# Altium footprint library WR-TBL_Spring Clamp.PcbLib: 258 footprints (part 16 of 17)
Each footprint in its own frame and in the unit in brackets; x right, y up, seen from the top. Pads: shape width x height; smd on the part's side, far side on the other; paste and mask are expansions set on the pad; w line width, h text height; cw(c..) or ccw(c..) is an arc to the next point about the centre after c.
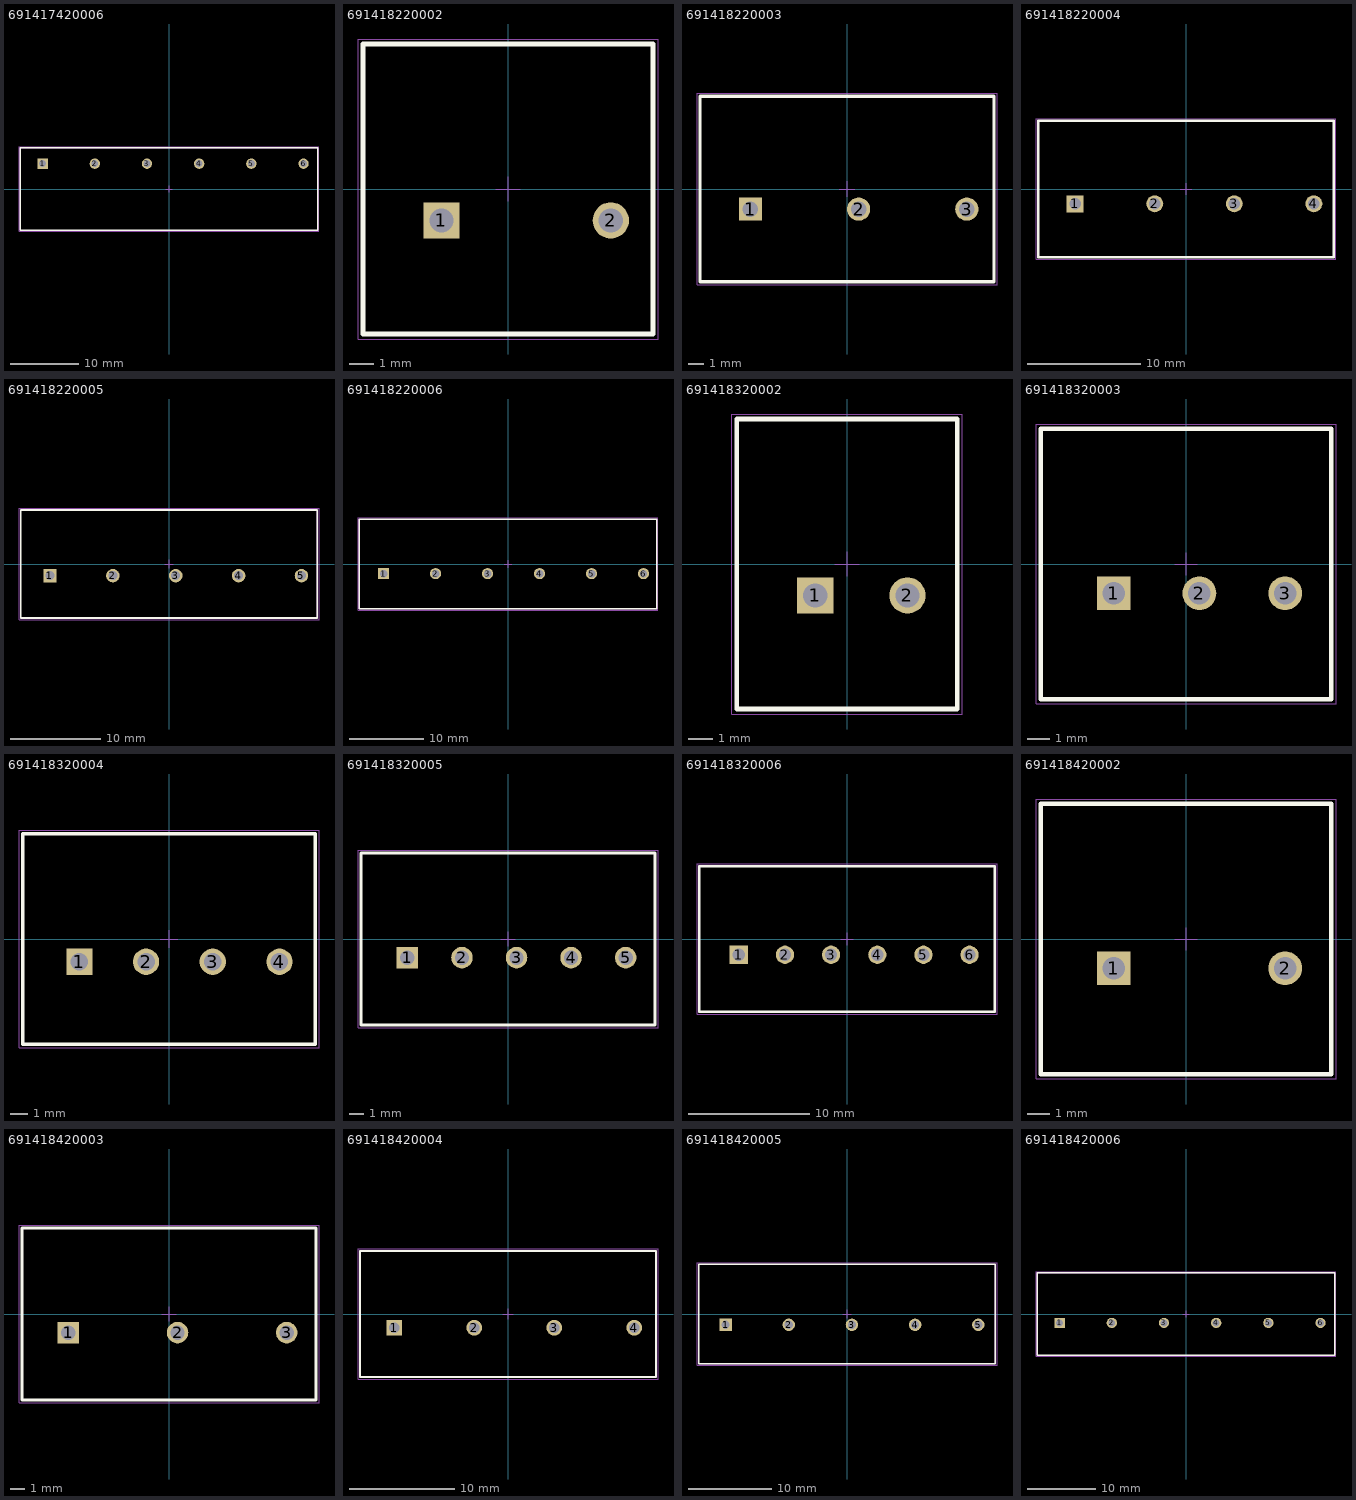
[diagram p15: the footprints below, top view; thin cyan lines are the x and y axes]

## 691417420006 [mm] "7.62 mm 45deg Entry Screwless, 6p"
height 13.2
pads (6):
  rect 1.5x1.5 hole 1: 1(-18.455,3.7)
  round 1.5 hole 1: 2(-10.835,3.7) 3(-3.215,3.7) 4(4.405,3.7) 5(12.025,3.7) 6(19.645,3.7)
Top Overlay:
  lines w0.2: -21.705,-6 -21.705,6 21.705,6 21.705,-6 -21.705,-6
Mechanical 13:
  lines w0.1: -21.705,-6 21.705,-6 21.705,6 -21.705,6 -21.705,-6
Mechanical 15:
  lines w0.05: -0.5,0 0.5,0 ; 0,-0.5 0,0.5 ; -21.905,-6.2 -21.905,6.2 21.905,6.2 21.905,-6.2 -21.905,-6.2
3D body "691417420006.stp": height 13.28, standoff -3.52, extent -21.705,-6 21.706,6

## 691418220002 [mm] "Serie 4182-7.00mm 45deg Cable Entry Screwless, 2 pins"
height 13.2
pads (2):
  rect 1.5x1.5 hole 1: 1(-2.75,-1.3)
  round 1.5 hole 1: 2(4.25,-1.3)
Top Overlay:
  lines w0.2: -6,-6 -6,6 6,6 6,-6 -6,-6
Mechanical 13:
  lines w0.1: -6,-6 6,-6 6,6 -6,6 -6,-6
Mechanical 15:
  lines w0.05: -0.5,0 0.5,0 ; 0,-0.5 0,0.5 ; -6.2,-6.2 -6.2,6.2 6.2,6.2 6.2,-6.2 -6.2,-6.2
3D body "691418220002.stp": height 13.23, standoff -3.57, extent -6,-6 6,6

## 691418220003 [mm] "Serie 4182-7.00mm 45deg Cable Entry Screwless, 3 pins"
height 13.2
pads (3):
  rect 1.5x1.5 hole 1: 1(-6.25,-1.3)
  round 1.5 hole 1: 2(0.75,-1.3) 3(7.75,-1.3)
Top Overlay:
  lines w0.2: -9.5,-6 -9.5,6 9.5,6 9.5,-6 -9.5,-6
Mechanical 13:
  lines w0.1: -9.5,-6 9.5,-6 9.5,6 -9.5,6 -9.5,-6
Mechanical 15:
  lines w0.05: -0.5,0 0.5,0 ; 0,-0.5 0,0.5 ; -9.7,-6.2 -9.7,6.2 9.7,6.2 9.7,-6.2 -9.7,-6.2
3D body "691418220003.stp": height 13.23, standoff -3.57, extent -9.5,-6 9.5,6

## 691418220004 [mm] "Serie 4182-7.00mm 45deg Cable Entry Screwless, 4 pins"
height 13.2
pads (4):
  rect 1.5x1.5 hole 1: 1(-9.75,-1.3)
  round 1.5 hole 1: 2(-2.75,-1.3) 3(4.25,-1.3) 4(11.25,-1.3)
Top Overlay:
  lines w0.2: -13,-6 -13,6 13,6 13,-6 -13,-6
Mechanical 13:
  lines w0.1: -13,-6 13,-6 13,6 -13,6 -13,-6
Mechanical 15:
  lines w0.05: -0.5,0 0.5,0 ; 0,-0.5 0,0.5 ; -13.2,-6.2 -13.2,6.2 13.2,6.2 13.2,-6.2 -13.2,-6.2
3D body "691418220004.stp": height 13.23, standoff -3.57, extent -13,-6 13,6

## 691418220005 [mm] "Serie 4182-7.00mm 45deg Cable Entry Screwless, 5 pins"
height 13.2
pads (5):
  rect 1.5x1.5 hole 1: 1(-13.25,-1.3)
  round 1.5 hole 1: 2(-6.25,-1.3) 3(0.75,-1.3) 4(7.75,-1.3) 5(14.75,-1.3)
Top Overlay:
  lines w0.2: -16.5,-6 16.5,-6 16.5,6 -16.5,6 -16.5,-6
Mechanical 13:
  lines w0.1: -16.5,-6 -16.5,6 16.5,6 16.5,-6 -16.5,-6
Mechanical 15:
  lines w0.05: -0.5,0 0.5,0 ; 0,-0.5 0,0.5 ; -16.7,-6.2 16.7,-6.2 16.7,6.2 -16.7,6.2 -16.7,-6.2
3D body "691418220005.stp": height 13.23, standoff -3.57, extent -16.5,-6 16.5,6

## 691418220006 [mm] "Serie 4182-7.00mm 45deg Cable Entry Screwless, 6 pins"
height 13.2
pads (6):
  rect 1.5x1.5 hole 1: 1(-16.75,-1.3)
  round 1.5 hole 1: 2(-9.75,-1.3) 3(-2.75,-1.3) 4(4.25,-1.3) 5(11.25,-1.3) 6(18.25,-1.3)
Top Overlay:
  lines w0.2: -20,-6 20,-6 20,6 -20,6 -20,-6
Mechanical 13:
  lines w0.1: -20,-6 -20,6 20,6 20,-6 -20,-6
Mechanical 15:
  lines w0.05: -0.5,0 0.5,0 ; 0,-0.5 0,0.5 ; -20.2,-6.2 20.2,-6.2 20.2,6.2 -20.2,6.2 -20.2,-6.2
3D body "691418220006.stp": height 13.23, standoff -3.57, extent -20,-6 20,6

## 691418320002 [mm] "Serie 4183-3.81mm 45° Cable Entry Screwless, 2 pins"
height 13.2
pads (2):
  rect 1.5x1.5 hole 1: 1(-1.31,-1.3)
  round 1.5 hole 1: 2(2.5,-1.3)
Top Overlay:
  lines w0.2: -4.56,-6 4.56,-6 4.56,6 -4.56,6 -4.56,-6
Mechanical 13:
  lines w0.1: -4.56,-6 -4.56,6 4.56,6 4.56,-6 -4.56,-6
Mechanical 15:
  lines w0.05: -0.5,0 0.5,0 ; 0,-0.5 0,0.5 ; -4.76,-6.2 4.76,-6.2 4.76,6.2 -4.76,6.2 -4.76,-6.2
3D body "691418320002.stp": height 13.28, standoff -3.52, extent -4.56,-6 4.56,6

## 691418320003 [mm] "Serie 4183-3.81mm 45° Cable Entry Screwless, 3 pins"
height 13.2
pads (3):
  rect 1.5x1.5 hole 1: 1(-3.215,-1.3)
  round 1.5 hole 1: 2(0.595,-1.3) 3(4.405,-1.3)
Top Overlay:
  lines w0.2: -6.465,-6 6.465,-6 6.465,6 -6.465,6 -6.465,-6
Mechanical 13:
  lines w0.1: -6.465,-6 -6.465,6 6.465,6 6.465,-6 -6.465,-6
Mechanical 15:
  lines w0.05: -0.5,0 0.5,0 ; 0,-0.5 0,0.5 ; -6.665,-6.2 6.665,-6.2 6.665,6.2 -6.665,6.2 -6.665,-6.2
3D body "691418320003.stp": height 13.28, standoff -3.52, extent -6.465,-6 6.465,6

## 691418320004 [mm] "Serie 4183-3.81mm 45° Cable Entry Screwless, 4 pins"
height 13.2
pads (4):
  rect 1.5x1.5 hole 1: 1(-5.12,-1.3)
  round 1.5 hole 1: 2(-1.31,-1.3) 3(2.5,-1.3) 4(6.31,-1.3)
Top Overlay:
  lines w0.2: -8.37,-6 8.37,-6 8.37,6 -8.37,6 -8.37,-6
Mechanical 13:
  lines w0.1: -8.37,-6 -8.37,6 8.37,6 8.37,-6 -8.37,-6
Mechanical 15:
  lines w0.05: -0.5,0 0.5,0 ; 0,-0.5 0,0.5 ; -8.57,-6.2 8.57,-6.2 8.57,6.2 -8.57,6.2 -8.57,-6.2
3D body "691418320004.stp": height 13.28, standoff -3.52, extent -8.37,-6 8.37,6

## 691418320005 [mm] "Serie 4183-3.81mm 45° Cable Entry Screwless, 5 pins"
height 13.2
pads (5):
  rect 1.5x1.5 hole 1: 1(-7.025,-1.3)
  round 1.5 hole 1: 2(-3.215,-1.3) 3(0.595,-1.3) 4(4.405,-1.3) 5(8.215,-1.3)
Top Overlay:
  lines w0.2: -10.275,-6 -10.275,6 10.275,6 10.275,-6 -10.275,-6
Mechanical 13:
  lines w0.1: -10.275,-6 10.275,-6 10.275,6 -10.275,6 -10.275,-6
Mechanical 15:
  lines w0.05: -0.5,0 0.5,0 ; 0,-0.5 0,0.5 ; -10.475,-6.2 -10.475,6.2 10.475,6.2 10.475,-6.2 -10.475,-6.2
3D body "691418320005.stp": height 13.28, standoff -3.52, extent -10.275,-6 10.275,6

## 691418320006 [mm] "Serie 4183-3.81mm 45° Cable Entry Screwless, 6 pins"
height 13.2
pads (6):
  rect 1.5x1.5 hole 1: 1(-8.93,-1.3)
  round 1.5 hole 1: 2(-5.12,-1.3) 3(-1.31,-1.3) 4(2.5,-1.3) 5(6.31,-1.3) 6(10.12,-1.3)
Top Overlay:
  lines w0.2: -12.18,-6 -12.18,6 12.18,6 12.18,-6 -12.18,-6
Mechanical 13:
  lines w0.1: -12.18,-6 12.18,-6 12.18,6 -12.18,6 -12.18,-6
Mechanical 15:
  lines w0.05: -0.5,0 0.5,0 ; 0,-0.5 0,0.5 ; -12.38,-6.2 -12.38,6.2 12.38,6.2 12.38,-6.2 -12.38,-6.2
3D body "691418320006.stp": height 13.28, standoff -3.52, extent -12.18,-6 12.18,6

## 691418420002 [mm] "7.62 mm 45deg Entry Screwless, 2p"
height 13.2
pads (2):
  rect 1.5x1.5 hole 1: 1(-3.215,-1.3)
  round 1.5 hole 1: 2(4.405,-1.3)
Top Overlay:
  lines w0.2: -6.465,-6 -6.465,6 6.465,6 6.465,-6 -6.465,-6
Mechanical 13:
  lines w0.1: -6.465,-6 6.465,-6 6.465,6 -6.465,6 -6.465,-6
Mechanical 15:
  lines w0.05: -0.5,0 0.5,0 ; 0,-0.5 0,0.5 ; -6.665,-6.2 6.665,-6.2 6.665,6.2 -6.665,6.2 -6.665,-6.2
3D body "691418420002.stp": height 13.28, standoff -3.52, extent -6.465,-6 6.465,6

## 691418420003 [mm] "7.62 mm 45deg Entry Screwless, 3p"
height 13.2
pads (3):
  rect 1.5x1.5 hole 1: 1(-7.025,-1.3)
  round 1.5 hole 1: 2(0.595,-1.3) 3(8.215,-1.3)
Top Overlay:
  lines w0.2: -10.275,-6 -10.275,6 10.275,6 10.275,-6 -10.275,-6
Mechanical 13:
  lines w0.1: -10.275,-6 10.275,-6 10.275,6 -10.275,6 -10.275,-6
Mechanical 15:
  lines w0.05: -0.5,0 0.5,0 ; 0,-0.5 0,0.5 ; -10.475,-6.2 10.475,-6.2 10.475,6.2 -10.475,6.2 -10.475,-6.2
3D body "691418420003.stp": height 13.28, standoff -3.52, extent -10.275,-6 10.275,6

## 691418420004 [mm] "7.62 mm 45deg Entry Screwless, 4p"
height 13.2
pads (4):
  rect 1.5x1.5 hole 1: 1(-10.835,-1.3)
  round 1.5 hole 1: 2(-3.215,-1.3) 3(4.405,-1.3) 4(12.025,-1.3)
Top Overlay:
  lines w0.2: -14.085,-6 14.085,-6 14.085,6 -14.085,6 -14.085,-6
Mechanical 13:
  lines w0.1: -14.085,-6 -14.085,6 14.085,6 14.085,-6 -14.085,-6
Mechanical 15:
  lines w0.05: -0.5,0 0.5,0 ; 0,-0.5 0,0.5 ; -14.285,-6.2 -14.285,6.2 14.285,6.2 14.285,-6.2 -14.285,-6.2
3D body "691418420004.stp": height 13.28, standoff -3.52, extent -14.085,-6 14.085,6

## 691418420005 [mm] "7.62 mm 45deg Entry Screwless, 5p"
height 13.2
pads (5):
  rect 1.5x1.5 hole 1: 1(-14.645,-1.3)
  round 1.5 hole 1: 2(-7.025,-1.3) 3(0.595,-1.3) 4(8.215,-1.3) 5(15.835,-1.3)
Top Overlay:
  lines w0.2: -17.895,-6 17.895,-6 17.895,6 -17.895,6 -17.895,-6
Mechanical 13:
  lines w0.1: -17.895,-6 -17.895,6 17.895,6 17.895,-6 -17.895,-6
Mechanical 15:
  lines w0.05: -0.5,0 0.5,0 ; 0,-0.5 0,0.5 ; -18.095,-6.2 -18.095,6.2 18.095,6.2 18.095,-6.2 -18.095,-6.2
3D body "691418420005.stp": height 13.28, standoff -3.52, extent -17.895,-6 17.895,6

## 691418420006 [mm] "7.62 mm 45deg Entry Screwless, 6p"
height 13.2
pads (6):
  rect 1.5x1.5 hole 1: 1(-18.455,-1.3)
  round 1.5 hole 1: 2(-10.835,-1.3) 3(-3.215,-1.3) 4(4.405,-1.3) 5(12.025,-1.3) 6(19.645,-1.3)
Top Overlay:
  lines w0.2: -21.705,-6 -21.705,6 21.705,6 21.705,-6 -21.705,-6
Mechanical 13:
  lines w0.1: -21.705,-6 21.705,-6 21.705,6 -21.705,6 -21.705,-6
Mechanical 15:
  lines w0.05: -0.5,0 0.5,0 ; 0,-0.5 0,0.5 ; -21.905,-6.2 21.905,-6.2 21.905,6.2 -21.905,6.2 -21.905,-6.2
3D body "691418420006.stp": height 13.28, standoff -3.52, extent -21.705,-6 21.705,6